# Altium footprint library PCB1.PcbLib: 98 footprints (part 7 of 7)
Each footprint in its own frame and in the unit in brackets; x right, y up, seen from the top. Pads: shape width x height; smd on the part's side, far side on the other; paste and mask are expansions set on the pad; w line width, h text height; cw(c..) or ccw(c..) is an arc to the next point about the centre after c.
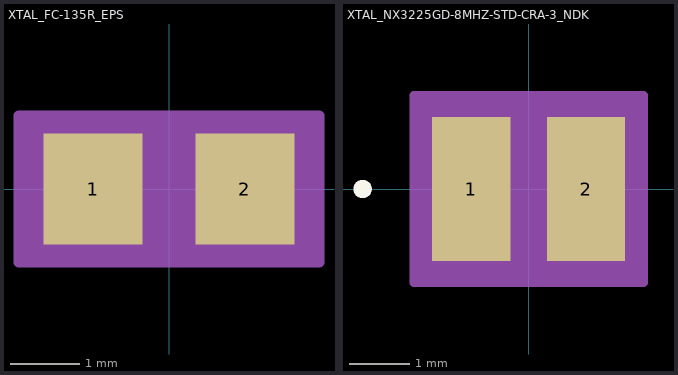
[diagram p6: the footprints below, top view; thin cyan lines are the x and y axes]

## XTAL_FC-135R_EPS [mil]
pads (2):
  rect 56x63 smd paste+0 mask+0: 1(-43,0) 2(43,0)
Top 3D Body:
  lines w1: -75,-41.5 75,-41.5 75,41.5 -75,41.5 -75,-41.5 ; -65,-31.5 -65,31.5 65,31.5 65,-31.5 -65,-31.5
Top Courtyard:
  region: -75,-41.5 -85,-41.5 -85,41.5 -75,41.5 75,41.5 85,41.5 85,-41.5 75,-41.5
  lines w6: -85,-41.5 -75,-41.5 75,-41.5 85,-41.5 85,41.5 75,41.5 -75,41.5 -85,41.5 -85,-41.5
3D body "XTAL_FC-135R_EPS.step": height 35, standoff 0, extent -71.5,-42.99 71.5,42.99

## XTAL_NX3225GD-8MHZ-STD-CRA-3_NDK [mil]
pads (2):
  rect 51x94 smd paste+0 mask+0: 1(-37.5,0) 2(37.5,0)
Top Overlay:
  circle w6: c-108.5,0 r3
Top 3D Body:
  circle w0: c0,0 r3
  lines w1: -65,-51 -65,51 65,51 65,-51 -65,-51
Top Courtyard:
  region: -75,-57 -75,57 -75,61 75,61 75,57 75,-57 75,-61 -75,-61
  lines w6: -75,-61 75,-61 75,-57 75,57 75,61 -75,61 -75,57 -75,-57 -75,-61
3D body "XTAL_NX3225GD-8MHZ-STD-CRA-3_NDK.step": height 39.09, standoff 0, extent -65,-50.98 65,50.98